# Altium footprint library Semicon-Discrete.pcblib: 205 footprints (part 5 of 13)
Each footprint in its own frame and in the unit in brackets; x right, y up, seen from the top. Pads: shape width x height; smd on the part's side, far side on the other; paste and mask are expansions set on the pad; w line width, h text height; cw(c..) or ccw(c..) is an arc to the next point about the centre after c.
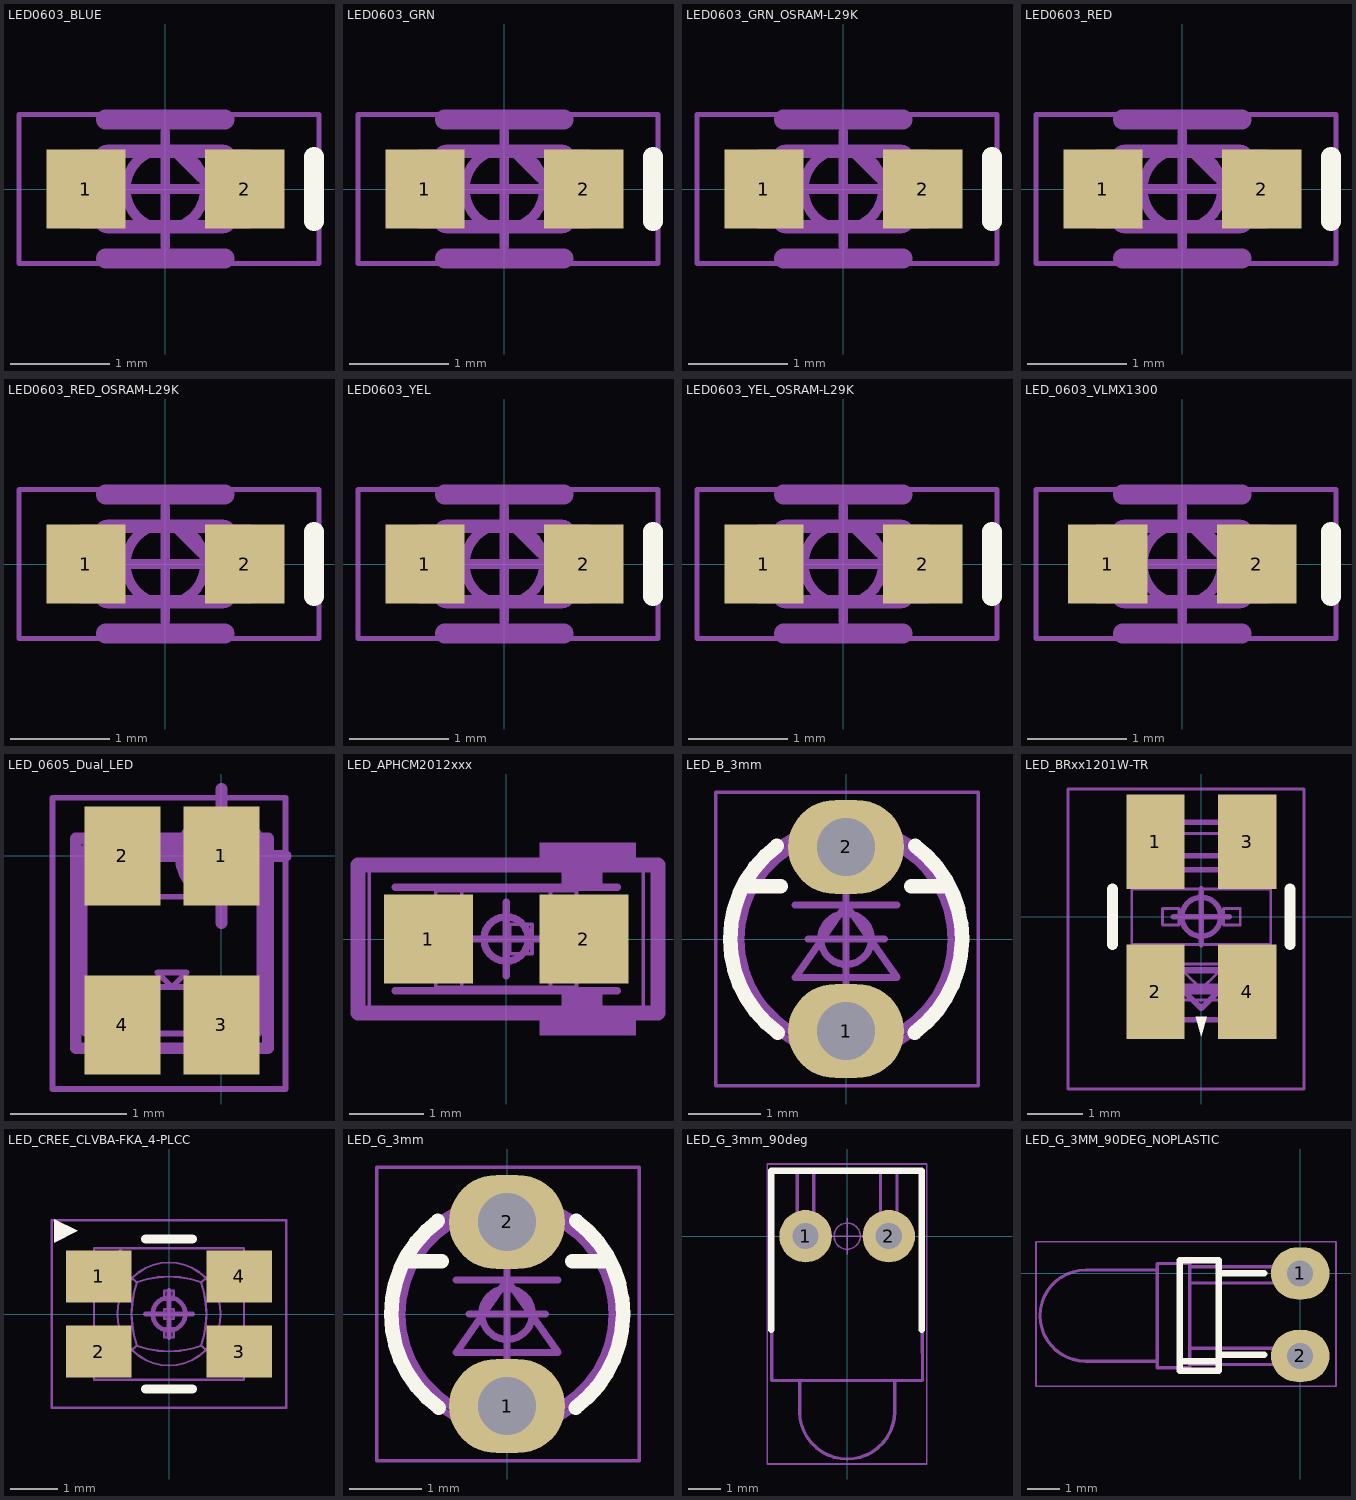
[diagram p4: the footprints below, top view; thin cyan lines are the x and y axes]

## LED0603_BLUE [mm] "SMT LED - 0603 - BLUE"
height 0.65
pads (2):
  rect 0.8x0.8 smd: 1(-0.8,0) 2(0.8,0)
TopOverlay:
  lines w0.2: 1.5,-0.325 1.5,0.325
2-TopCompOutl:
  lines w0.1: 0.1,0.375 0.637,-0.163
  lines w0.102: -0.65,-0.3 cw(c-0.7,-0.3) -0.7,-0.35 -0.85,-0.35 -0.85,0.35 -0.7,0.35 cw(c-0.7,0.3) -0.65,0.3 ; -0.65,-0.3 -0.65,-0.357 ccw(c-0.562,-0.312) -0.629,-0.385 ccw(c-0.548,-0.177) -0.55,-0.4 ; -0.65,-0.3 -0.612,-0.262 ; -0.65,-0.3 -0.65,0.3 ; -0.65,0.3 -0.612,0.262 ; -0.65,0.3 -0.65,0.357 cw(c-0.562,0.312) -0.629,0.385 cw(c-0.548,0.177) -0.55,0.4 ; -0.612,-0.262 ccw(c-0.512,-0.262) -0.512,-0.362 ; -0.612,-0.262 -0.612,0.262 ; -0.612,0.262 cw(c-0.512,0.262) -0.512,0.362 ; -0.55,-0.4 -0.512,-0.362 ; -0.55,-0.4 0.55,-0.4 ; -0.55,0.4 -0.512,0.362 ; -0.55,0.4 0.55,0.4 ; -0.512,-0.362 0.512,-0.362 ; -0.512,0.362 0.512,0.362 ; 0.512,-0.362 ccw(c0.512,-0.262) 0.612,-0.262 ; 0.512,-0.362 0.55,-0.4 ; 0.512,0.362 cw(c0.512,0.262) 0.612,0.262 ; 0.512,0.362 0.55,0.4 ; 0.55,-0.4 ccw(c0.548,-0.177) 0.629,-0.385 ccw(c0.562,-0.312) 0.65,-0.357 0.65,-0.3 ; 0.55,0.4 cw(c0.548,0.179) 0.629,0.385 cw(c0.562,0.312) 0.65,0.357 0.65,0.3 ; 0.612,-0.262 0.612,0.262 ; 0.612,-0.262 0.65,-0.3 ; 0.612,0.262 0.65,0.3 ; 0.65,-0.3 ccw(c0.7,-0.3) 0.7,-0.35 0.85,-0.35 0.85,0.35 0.7,0.35 ccw(c0.7,0.3) 0.65,0.3 ; 0.65,-0.3 0.65,0.3
4-TopCourty:
  circle w0.1: c0,0 r0.4
  lines w0.05: -1.475,-0.75 -1.475,0.75 1.55,0.75 1.55,-0.75 -1.475,-0.75
  lines w0.1: -0.55,0 0.55,0 ; 0,-0.575 0,0.575
7-TopAssy:
  lines w0.1: 0.1,0.375 0.637,-0.163
  lines w0.102: -0.65,-0.3 cw(c-0.7,-0.3) -0.7,-0.35 -0.85,-0.35 -0.85,0.35 -0.7,0.35 cw(c-0.7,0.3) -0.65,0.3 ; -0.65,-0.3 -0.65,0.3 ; -0.65,-0.3 -0.612,-0.262 ; -0.65,-0.3 -0.65,-0.357 ccw(c-0.562,-0.312) -0.629,-0.385 ccw(c-0.548,-0.177) -0.55,-0.4 ; -0.65,0.3 -0.65,0.357 cw(c-0.562,0.312) -0.629,0.385 cw(c-0.548,0.177) -0.55,0.4 ; -0.65,0.3 -0.612,0.262 ; -0.612,-0.262 ccw(c-0.512,-0.262) -0.512,-0.362 ; -0.612,-0.262 -0.612,0.262 ; -0.612,0.262 cw(c-0.512,0.262) -0.512,0.362 ; -0.55,-0.4 0.55,-0.4 ; -0.55,-0.4 -0.512,-0.362 ; -0.55,0.4 0.55,0.4 ; -0.55,0.4 -0.512,0.362 ; -0.512,-0.362 0.512,-0.362 ; -0.512,0.362 0.512,0.362 ; 0.512,-0.362 ccw(c0.512,-0.262) 0.612,-0.262 ; 0.512,-0.362 0.55,-0.4 ; 0.512,0.362 cw(c0.512,0.262) 0.612,0.262 ; 0.512,0.362 0.55,0.4 ; 0.55,-0.4 ccw(c0.548,-0.177) 0.629,-0.385 ccw(c0.562,-0.312) 0.65,-0.357 0.65,-0.3 ; 0.55,0.4 cw(c0.548,0.179) 0.629,0.385 cw(c0.562,0.312) 0.65,0.357 0.65,0.3 ; 0.612,-0.262 0.65,-0.3 ; 0.612,-0.262 0.612,0.262 ; 0.612,0.262 0.65,0.3 ; 0.65,-0.3 ccw(c0.7,-0.3) 0.7,-0.35 0.85,-0.35 0.85,0.35 0.7,0.35 ccw(c0.7,0.3) 0.65,0.3 ; 0.65,-0.3 0.65,0.3
  text ".Designator" at -0.95,0.525 h1.6
13-SMDTopOverlay:
  lines w0.2: -0.6,-0.7 0.6,-0.7 ; -0.6,0.7 0.6,0.7
3D body "LED0603_BLUE.STEP": height 0.65, standoff 0, extent -0.85,-0.4 0.85,0.4

## LED0603_GRN [mm] "SMT LED - 0603 - GREEN"
height 0.65
pads (2):
  rect 0.8x0.8 smd: 1(-0.8,0) 2(0.8,0)
TopOverlay:
  lines w0.2: 1.5,-0.325 1.5,0.325
2-TopCompOutl:
  lines w0.1: 0.1,0.375 0.637,-0.163
  lines w0.102: -0.65,-0.3 cw(c-0.7,-0.3) -0.7,-0.35 -0.85,-0.35 -0.85,0.35 -0.7,0.35 cw(c-0.7,0.3) -0.65,0.3 ; -0.65,-0.3 -0.65,-0.357 ccw(c-0.562,-0.312) -0.629,-0.385 ccw(c-0.548,-0.177) -0.55,-0.4 ; -0.65,-0.3 -0.612,-0.262 ; -0.65,-0.3 -0.65,0.3 ; -0.65,0.3 -0.612,0.262 ; -0.65,0.3 -0.65,0.357 cw(c-0.562,0.312) -0.629,0.385 cw(c-0.548,0.177) -0.55,0.4 ; -0.612,-0.262 ccw(c-0.512,-0.262) -0.512,-0.362 ; -0.612,-0.262 -0.612,0.262 ; -0.612,0.262 cw(c-0.512,0.262) -0.512,0.362 ; -0.55,-0.4 -0.512,-0.362 ; -0.55,-0.4 0.55,-0.4 ; -0.55,0.4 -0.512,0.362 ; -0.55,0.4 0.55,0.4 ; -0.512,-0.362 0.512,-0.362 ; -0.512,0.362 0.512,0.362 ; 0.512,-0.362 ccw(c0.512,-0.262) 0.612,-0.262 ; 0.512,-0.362 0.55,-0.4 ; 0.512,0.362 cw(c0.512,0.262) 0.612,0.262 ; 0.512,0.362 0.55,0.4 ; 0.55,-0.4 ccw(c0.548,-0.177) 0.629,-0.385 ccw(c0.562,-0.312) 0.65,-0.357 0.65,-0.3 ; 0.55,0.4 cw(c0.548,0.179) 0.629,0.385 cw(c0.562,0.312) 0.65,0.357 0.65,0.3 ; 0.612,-0.262 0.612,0.262 ; 0.612,-0.262 0.65,-0.3 ; 0.612,0.262 0.65,0.3 ; 0.65,-0.3 ccw(c0.7,-0.3) 0.7,-0.35 0.85,-0.35 0.85,0.35 0.7,0.35 ccw(c0.7,0.3) 0.65,0.3 ; 0.65,-0.3 0.65,0.3
4-TopCourty:
  circle w0.1: c0,0 r0.4
  lines w0.05: -1.475,-0.75 -1.475,0.75 1.55,0.75 1.55,-0.75 -1.475,-0.75
  lines w0.1: -0.55,0 0.55,0 ; 0,-0.575 0,0.575
7-TopAssy:
  lines w0.1: 0.1,0.375 0.637,-0.163
  lines w0.102: -0.65,-0.3 cw(c-0.7,-0.3) -0.7,-0.35 -0.85,-0.35 -0.85,0.35 -0.7,0.35 cw(c-0.7,0.3) -0.65,0.3 ; -0.65,-0.3 -0.65,0.3 ; -0.65,-0.3 -0.612,-0.262 ; -0.65,-0.3 -0.65,-0.357 ccw(c-0.562,-0.312) -0.629,-0.385 ccw(c-0.548,-0.177) -0.55,-0.4 ; -0.65,0.3 -0.65,0.357 cw(c-0.562,0.312) -0.629,0.385 cw(c-0.548,0.177) -0.55,0.4 ; -0.65,0.3 -0.612,0.262 ; -0.612,-0.262 ccw(c-0.512,-0.262) -0.512,-0.362 ; -0.612,-0.262 -0.612,0.262 ; -0.612,0.262 cw(c-0.512,0.262) -0.512,0.362 ; -0.55,-0.4 0.55,-0.4 ; -0.55,-0.4 -0.512,-0.362 ; -0.55,0.4 0.55,0.4 ; -0.55,0.4 -0.512,0.362 ; -0.512,-0.362 0.512,-0.362 ; -0.512,0.362 0.512,0.362 ; 0.512,-0.362 ccw(c0.512,-0.262) 0.612,-0.262 ; 0.512,-0.362 0.55,-0.4 ; 0.512,0.362 cw(c0.512,0.262) 0.612,0.262 ; 0.512,0.362 0.55,0.4 ; 0.55,-0.4 ccw(c0.548,-0.177) 0.629,-0.385 ccw(c0.562,-0.312) 0.65,-0.357 0.65,-0.3 ; 0.55,0.4 cw(c0.548,0.179) 0.629,0.385 cw(c0.562,0.312) 0.65,0.357 0.65,0.3 ; 0.612,-0.262 0.65,-0.3 ; 0.612,-0.262 0.612,0.262 ; 0.612,0.262 0.65,0.3 ; 0.65,-0.3 ccw(c0.7,-0.3) 0.7,-0.35 0.85,-0.35 0.85,0.35 0.7,0.35 ccw(c0.7,0.3) 0.65,0.3 ; 0.65,-0.3 0.65,0.3
  text ".Designator" at -0.95,0.525 h1.6
13-SMDTopOverlay:
  lines w0.2: -0.6,-0.7 0.6,-0.7 ; -0.6,0.7 0.6,0.7
3D body "LED0603_GRN_OSRAM-L29K.STEP": height 0.65, standoff 0, extent -0.85,-0.4 0.85,0.4

## LED0603_GRN_OSRAM-L29K [mm] "SMT LED - 0603 - GREEN - OSRAM - L29K"
height 0.65
pads (2):
  rect 0.8x0.8 smd: 1(-0.8,0) 2(0.8,0)
TopOverlay:
  lines w0.2: 1.5,-0.325 1.5,0.325
2-TopCompOutl:
  lines w0.1: 0.1,0.375 0.637,-0.163
  lines w0.102: -0.65,-0.3 cw(c-0.7,-0.3) -0.7,-0.35 -0.85,-0.35 -0.85,0.35 -0.7,0.35 cw(c-0.7,0.3) -0.65,0.3 ; -0.65,-0.3 -0.65,0.3 ; -0.65,-0.3 -0.612,-0.262 ; -0.65,-0.3 -0.65,-0.357 ccw(c-0.562,-0.312) -0.629,-0.385 ccw(c-0.548,-0.177) -0.55,-0.4 ; -0.65,0.3 -0.65,0.357 cw(c-0.562,0.312) -0.629,0.385 cw(c-0.548,0.177) -0.55,0.4 ; -0.65,0.3 -0.612,0.262 ; -0.612,-0.262 ccw(c-0.512,-0.262) -0.512,-0.362 ; -0.612,-0.262 -0.612,0.262 ; -0.612,0.262 cw(c-0.512,0.262) -0.512,0.362 ; -0.55,-0.4 0.55,-0.4 ; -0.55,-0.4 -0.512,-0.362 ; -0.55,0.4 0.55,0.4 ; -0.55,0.4 -0.512,0.362 ; -0.512,-0.362 0.512,-0.362 ; -0.512,0.362 0.512,0.362 ; 0.512,-0.362 ccw(c0.512,-0.262) 0.612,-0.262 ; 0.512,-0.362 0.55,-0.4 ; 0.512,0.362 cw(c0.512,0.262) 0.612,0.262 ; 0.512,0.362 0.55,0.4 ; 0.55,-0.4 ccw(c0.548,-0.177) 0.629,-0.385 ccw(c0.562,-0.312) 0.65,-0.357 0.65,-0.3 ; 0.55,0.4 cw(c0.548,0.179) 0.629,0.385 cw(c0.562,0.312) 0.65,0.357 0.65,0.3 ; 0.612,-0.262 0.65,-0.3 ; 0.612,-0.262 0.612,0.262 ; 0.612,0.262 0.65,0.3 ; 0.65,-0.3 ccw(c0.7,-0.3) 0.7,-0.35 0.85,-0.35 0.85,0.35 0.7,0.35 ccw(c0.7,0.3) 0.65,0.3 ; 0.65,-0.3 0.65,0.3
4-TopCourty:
  circle w0.1: c0,0 r0.4
  lines w0.05: -1.475,-0.75 1.55,-0.75 1.55,0.75 -1.475,0.75 -1.475,-0.75
  lines w0.1: -0.55,0 0.55,0 ; 0,-0.575 0,0.575
7-TopAssy:
  lines w0.1: 0.1,0.375 0.637,-0.163
  lines w0.102: -0.65,-0.3 cw(c-0.7,-0.3) -0.7,-0.35 -0.85,-0.35 -0.85,0.35 -0.7,0.35 cw(c-0.7,0.3) -0.65,0.3 ; -0.65,-0.3 -0.65,-0.357 ccw(c-0.562,-0.312) -0.629,-0.385 ccw(c-0.548,-0.177) -0.55,-0.4 ; -0.65,-0.3 -0.612,-0.262 ; -0.65,-0.3 -0.65,0.3 ; -0.65,0.3 -0.612,0.262 ; -0.65,0.3 -0.65,0.357 cw(c-0.562,0.312) -0.629,0.385 cw(c-0.548,0.177) -0.55,0.4 ; -0.612,-0.262 ccw(c-0.512,-0.262) -0.512,-0.362 ; -0.612,-0.262 -0.612,0.262 ; -0.612,0.262 cw(c-0.512,0.262) -0.512,0.362 ; -0.55,-0.4 -0.512,-0.362 ; -0.55,-0.4 0.55,-0.4 ; -0.55,0.4 -0.512,0.362 ; -0.55,0.4 0.55,0.4 ; -0.512,-0.362 0.512,-0.362 ; -0.512,0.362 0.512,0.362 ; 0.512,-0.362 ccw(c0.512,-0.262) 0.612,-0.262 ; 0.512,-0.362 0.55,-0.4 ; 0.512,0.362 cw(c0.512,0.262) 0.612,0.262 ; 0.512,0.362 0.55,0.4 ; 0.55,-0.4 ccw(c0.548,-0.177) 0.629,-0.385 ccw(c0.562,-0.312) 0.65,-0.357 0.65,-0.3 ; 0.55,0.4 cw(c0.548,0.179) 0.629,0.385 cw(c0.562,0.312) 0.65,0.357 0.65,0.3 ; 0.612,-0.262 0.612,0.262 ; 0.612,-0.262 0.65,-0.3 ; 0.612,0.262 0.65,0.3 ; 0.65,-0.3 ccw(c0.7,-0.3) 0.7,-0.35 0.85,-0.35 0.85,0.35 0.7,0.35 ccw(c0.7,0.3) 0.65,0.3 ; 0.65,-0.3 0.65,0.3
  text ".Designator" at -0.95,0.525 h1.6
13-SMDTopOverlay:
  lines w0.2: -0.6,-0.7 0.6,-0.7 ; -0.6,0.7 0.6,0.7
3D body "LED0603_GRN_OSRAM-L29K.STEP": height 0.65, standoff 0, extent -0.85,-0.4 0.85,0.4

## LED0603_RED [mm] "SMT LED - 0603 - RED"
height 0.65
pads (2):
  rect 0.8x0.8 smd: 1(-0.8,0) 2(0.8,0)
TopOverlay:
  lines w0.2: 1.5,-0.325 1.5,0.325
2-TopCompOutl:
  lines w0.1: 0.1,0.375 0.637,-0.163
  lines w0.102: -0.65,-0.3 cw(c-0.7,-0.3) -0.7,-0.35 -0.85,-0.35 -0.85,0.35 -0.7,0.35 cw(c-0.7,0.3) -0.65,0.3 ; -0.65,-0.3 -0.65,-0.357 ccw(c-0.562,-0.312) -0.629,-0.385 ccw(c-0.548,-0.177) -0.55,-0.4 ; -0.65,-0.3 -0.612,-0.262 ; -0.65,-0.3 -0.65,0.3 ; -0.65,0.3 -0.612,0.262 ; -0.65,0.3 -0.65,0.357 cw(c-0.562,0.312) -0.629,0.385 cw(c-0.548,0.177) -0.55,0.4 ; -0.612,-0.262 ccw(c-0.512,-0.262) -0.512,-0.362 ; -0.612,-0.262 -0.612,0.262 ; -0.612,0.262 cw(c-0.512,0.262) -0.512,0.362 ; -0.55,-0.4 -0.512,-0.362 ; -0.55,-0.4 0.55,-0.4 ; -0.55,0.4 -0.512,0.362 ; -0.55,0.4 0.55,0.4 ; -0.512,-0.362 0.512,-0.362 ; -0.512,0.362 0.512,0.362 ; 0.512,-0.362 ccw(c0.512,-0.262) 0.612,-0.262 ; 0.512,-0.362 0.55,-0.4 ; 0.512,0.362 cw(c0.512,0.262) 0.612,0.262 ; 0.512,0.362 0.55,0.4 ; 0.55,-0.4 ccw(c0.548,-0.177) 0.629,-0.385 ccw(c0.562,-0.312) 0.65,-0.357 0.65,-0.3 ; 0.55,0.4 cw(c0.548,0.179) 0.629,0.385 cw(c0.562,0.312) 0.65,0.357 0.65,0.3 ; 0.612,-0.262 0.612,0.262 ; 0.612,-0.262 0.65,-0.3 ; 0.612,0.262 0.65,0.3 ; 0.65,-0.3 ccw(c0.7,-0.3) 0.7,-0.35 0.85,-0.35 0.85,0.35 0.7,0.35 ccw(c0.7,0.3) 0.65,0.3 ; 0.65,-0.3 0.65,0.3
4-TopCourty:
  circle w0.1: c0,0 r0.4
  lines w0.05: -1.475,-0.75 -1.475,0.75 1.55,0.75 1.55,-0.75 -1.475,-0.75
  lines w0.1: -0.55,0 0.55,0 ; 0,-0.575 0,0.575
7-TopAssy:
  lines w0.1: 0.1,0.375 0.637,-0.163
  lines w0.102: -0.65,-0.3 cw(c-0.7,-0.3) -0.7,-0.35 -0.85,-0.35 -0.85,0.35 -0.7,0.35 cw(c-0.7,0.3) -0.65,0.3 ; -0.65,-0.3 -0.65,0.3 ; -0.65,-0.3 -0.612,-0.262 ; -0.65,-0.3 -0.65,-0.357 ccw(c-0.562,-0.312) -0.629,-0.385 ccw(c-0.548,-0.177) -0.55,-0.4 ; -0.65,0.3 -0.65,0.357 cw(c-0.562,0.312) -0.629,0.385 cw(c-0.548,0.177) -0.55,0.4 ; -0.65,0.3 -0.612,0.262 ; -0.612,-0.262 ccw(c-0.512,-0.262) -0.512,-0.362 ; -0.612,-0.262 -0.612,0.262 ; -0.612,0.262 cw(c-0.512,0.262) -0.512,0.362 ; -0.55,-0.4 0.55,-0.4 ; -0.55,-0.4 -0.512,-0.362 ; -0.55,0.4 0.55,0.4 ; -0.55,0.4 -0.512,0.362 ; -0.512,-0.362 0.512,-0.362 ; -0.512,0.362 0.512,0.362 ; 0.512,-0.362 ccw(c0.512,-0.262) 0.612,-0.262 ; 0.512,-0.362 0.55,-0.4 ; 0.512,0.362 cw(c0.512,0.262) 0.612,0.262 ; 0.512,0.362 0.55,0.4 ; 0.55,-0.4 ccw(c0.548,-0.177) 0.629,-0.385 ccw(c0.562,-0.312) 0.65,-0.357 0.65,-0.3 ; 0.55,0.4 cw(c0.548,0.179) 0.629,0.385 cw(c0.562,0.312) 0.65,0.357 0.65,0.3 ; 0.612,-0.262 0.65,-0.3 ; 0.612,-0.262 0.612,0.262 ; 0.612,0.262 0.65,0.3 ; 0.65,-0.3 ccw(c0.7,-0.3) 0.7,-0.35 0.85,-0.35 0.85,0.35 0.7,0.35 ccw(c0.7,0.3) 0.65,0.3 ; 0.65,-0.3 0.65,0.3
  text ".Designator" at -0.95,0.525 h1.6
13-SMDTopOverlay:
  lines w0.2: -0.6,-0.7 0.6,-0.7 ; -0.6,0.7 0.6,0.7
3D body "LED0603_OSRAM-L29K.STEP": height 0.65, standoff 0, extent -0.85,-0.4 0.85,0.4

## LED0603_RED_OSRAM-L29K [mm] "SMT LED - 0603 - RED - OSRAM - L29K"
height 0.65
pads (2):
  rect 0.8x0.8 smd: 1(-0.8,0) 2(0.8,0)
TopOverlay:
  lines w0.2: 1.5,-0.325 1.5,0.325
2-TopCompOutl:
  lines w0.1: 0.1,0.375 0.637,-0.163
  lines w0.102: -0.65,-0.3 cw(c-0.7,-0.3) -0.7,-0.35 -0.85,-0.35 -0.85,0.35 -0.7,0.35 cw(c-0.7,0.3) -0.65,0.3 ; -0.65,-0.3 -0.65,0.3 ; -0.65,-0.3 -0.612,-0.262 ; -0.65,-0.3 -0.65,-0.357 ccw(c-0.562,-0.312) -0.629,-0.385 ccw(c-0.548,-0.177) -0.55,-0.4 ; -0.65,0.3 -0.65,0.357 cw(c-0.562,0.312) -0.629,0.385 cw(c-0.548,0.177) -0.55,0.4 ; -0.65,0.3 -0.612,0.262 ; -0.612,-0.262 ccw(c-0.512,-0.262) -0.512,-0.362 ; -0.612,-0.262 -0.612,0.262 ; -0.612,0.262 cw(c-0.512,0.262) -0.512,0.362 ; -0.55,-0.4 0.55,-0.4 ; -0.55,-0.4 -0.512,-0.362 ; -0.55,0.4 0.55,0.4 ; -0.55,0.4 -0.512,0.362 ; -0.512,-0.362 0.512,-0.362 ; -0.512,0.362 0.512,0.362 ; 0.512,-0.362 ccw(c0.512,-0.262) 0.612,-0.262 ; 0.512,-0.362 0.55,-0.4 ; 0.512,0.362 cw(c0.512,0.262) 0.612,0.262 ; 0.512,0.362 0.55,0.4 ; 0.55,-0.4 ccw(c0.548,-0.177) 0.629,-0.385 ccw(c0.562,-0.312) 0.65,-0.357 0.65,-0.3 ; 0.55,0.4 cw(c0.548,0.179) 0.629,0.385 cw(c0.562,0.312) 0.65,0.357 0.65,0.3 ; 0.612,-0.262 0.65,-0.3 ; 0.612,-0.262 0.612,0.262 ; 0.612,0.262 0.65,0.3 ; 0.65,-0.3 ccw(c0.7,-0.3) 0.7,-0.35 0.85,-0.35 0.85,0.35 0.7,0.35 ccw(c0.7,0.3) 0.65,0.3 ; 0.65,-0.3 0.65,0.3
4-TopCourty:
  circle w0.1: c0,0 r0.4
  lines w0.05: -1.475,-0.75 1.55,-0.75 1.55,0.75 -1.475,0.75 -1.475,-0.75
  lines w0.1: -0.55,0 0.55,0 ; 0,-0.575 0,0.575
7-TopAssy:
  lines w0.1: 0.1,0.375 0.637,-0.163
  lines w0.102: -0.65,-0.3 cw(c-0.7,-0.3) -0.7,-0.35 -0.85,-0.35 -0.85,0.35 -0.7,0.35 cw(c-0.7,0.3) -0.65,0.3 ; -0.65,-0.3 -0.65,-0.357 ccw(c-0.562,-0.312) -0.629,-0.385 ccw(c-0.548,-0.177) -0.55,-0.4 ; -0.65,-0.3 -0.612,-0.262 ; -0.65,-0.3 -0.65,0.3 ; -0.65,0.3 -0.612,0.262 ; -0.65,0.3 -0.65,0.357 cw(c-0.562,0.312) -0.629,0.385 cw(c-0.548,0.177) -0.55,0.4 ; -0.612,-0.262 ccw(c-0.512,-0.262) -0.512,-0.362 ; -0.612,-0.262 -0.612,0.262 ; -0.612,0.262 cw(c-0.512,0.262) -0.512,0.362 ; -0.55,-0.4 -0.512,-0.362 ; -0.55,-0.4 0.55,-0.4 ; -0.55,0.4 -0.512,0.362 ; -0.55,0.4 0.55,0.4 ; -0.512,-0.362 0.512,-0.362 ; -0.512,0.362 0.512,0.362 ; 0.512,-0.362 ccw(c0.512,-0.262) 0.612,-0.262 ; 0.512,-0.362 0.55,-0.4 ; 0.512,0.362 cw(c0.512,0.262) 0.612,0.262 ; 0.512,0.362 0.55,0.4 ; 0.55,-0.4 ccw(c0.548,-0.177) 0.629,-0.385 ccw(c0.562,-0.312) 0.65,-0.357 0.65,-0.3 ; 0.55,0.4 cw(c0.548,0.179) 0.629,0.385 cw(c0.562,0.312) 0.65,0.357 0.65,0.3 ; 0.612,-0.262 0.612,0.262 ; 0.612,-0.262 0.65,-0.3 ; 0.612,0.262 0.65,0.3 ; 0.65,-0.3 ccw(c0.7,-0.3) 0.7,-0.35 0.85,-0.35 0.85,0.35 0.7,0.35 ccw(c0.7,0.3) 0.65,0.3 ; 0.65,-0.3 0.65,0.3
  text ".Designator" at -0.95,0.525 h1.6
13-SMDTopOverlay:
  lines w0.2: -0.6,-0.7 0.6,-0.7 ; -0.6,0.7 0.6,0.7
3D body "LED0603_OSRAM-L29K.STEP": height 0.65, standoff 0, extent -0.85,-0.4 0.85,0.4

## LED0603_YEL [mm] "SMT LED - 0603 - YELLOW"
height 0.65
pads (2):
  rect 0.8x0.8 smd: 1(-0.8,0) 2(0.8,0)
TopOverlay:
  lines w0.2: 1.5,-0.325 1.5,0.325
2-TopCompOutl:
  lines w0.1: 0.1,0.375 0.637,-0.163
  lines w0.102: -0.65,-0.3 cw(c-0.7,-0.3) -0.7,-0.35 -0.85,-0.35 -0.85,0.35 -0.7,0.35 cw(c-0.7,0.3) -0.65,0.3 ; -0.65,-0.3 -0.65,-0.357 ccw(c-0.562,-0.312) -0.629,-0.385 ccw(c-0.548,-0.177) -0.55,-0.4 ; -0.65,-0.3 -0.612,-0.262 ; -0.65,-0.3 -0.65,0.3 ; -0.65,0.3 -0.612,0.262 ; -0.65,0.3 -0.65,0.357 cw(c-0.562,0.312) -0.629,0.385 cw(c-0.548,0.177) -0.55,0.4 ; -0.612,-0.262 ccw(c-0.512,-0.262) -0.512,-0.362 ; -0.612,-0.262 -0.612,0.262 ; -0.612,0.262 cw(c-0.512,0.262) -0.512,0.362 ; -0.55,-0.4 -0.512,-0.362 ; -0.55,-0.4 0.55,-0.4 ; -0.55,0.4 -0.512,0.362 ; -0.55,0.4 0.55,0.4 ; -0.512,-0.362 0.512,-0.362 ; -0.512,0.362 0.512,0.362 ; 0.512,-0.362 ccw(c0.512,-0.262) 0.612,-0.262 ; 0.512,-0.362 0.55,-0.4 ; 0.512,0.362 cw(c0.512,0.262) 0.612,0.262 ; 0.512,0.362 0.55,0.4 ; 0.55,-0.4 ccw(c0.548,-0.177) 0.629,-0.385 ccw(c0.562,-0.312) 0.65,-0.357 0.65,-0.3 ; 0.55,0.4 cw(c0.548,0.179) 0.629,0.385 cw(c0.562,0.312) 0.65,0.357 0.65,0.3 ; 0.612,-0.262 0.612,0.262 ; 0.612,-0.262 0.65,-0.3 ; 0.612,0.262 0.65,0.3 ; 0.65,-0.3 ccw(c0.7,-0.3) 0.7,-0.35 0.85,-0.35 0.85,0.35 0.7,0.35 ccw(c0.7,0.3) 0.65,0.3 ; 0.65,-0.3 0.65,0.3
4-TopCourty:
  circle w0.1: c0,0 r0.4
  lines w0.05: -1.475,-0.75 -1.475,0.75 1.55,0.75 1.55,-0.75 -1.475,-0.75
  lines w0.1: -0.55,0 0.55,0 ; 0,-0.575 0,0.575
7-TopAssy:
  lines w0.1: 0.1,0.375 0.637,-0.163
  lines w0.102: -0.65,-0.3 cw(c-0.7,-0.3) -0.7,-0.35 -0.85,-0.35 -0.85,0.35 -0.7,0.35 cw(c-0.7,0.3) -0.65,0.3 ; -0.65,-0.3 -0.65,0.3 ; -0.65,-0.3 -0.612,-0.262 ; -0.65,-0.3 -0.65,-0.357 ccw(c-0.562,-0.312) -0.629,-0.385 ccw(c-0.548,-0.177) -0.55,-0.4 ; -0.65,0.3 -0.65,0.357 cw(c-0.562,0.312) -0.629,0.385 cw(c-0.548,0.177) -0.55,0.4 ; -0.65,0.3 -0.612,0.262 ; -0.612,-0.262 ccw(c-0.512,-0.262) -0.512,-0.362 ; -0.612,-0.262 -0.612,0.262 ; -0.612,0.262 cw(c-0.512,0.262) -0.512,0.362 ; -0.55,-0.4 0.55,-0.4 ; -0.55,-0.4 -0.512,-0.362 ; -0.55,0.4 0.55,0.4 ; -0.55,0.4 -0.512,0.362 ; -0.512,-0.362 0.512,-0.362 ; -0.512,0.362 0.512,0.362 ; 0.512,-0.362 ccw(c0.512,-0.262) 0.612,-0.262 ; 0.512,-0.362 0.55,-0.4 ; 0.512,0.362 cw(c0.512,0.262) 0.612,0.262 ; 0.512,0.362 0.55,0.4 ; 0.55,-0.4 ccw(c0.548,-0.177) 0.629,-0.385 ccw(c0.562,-0.312) 0.65,-0.357 0.65,-0.3 ; 0.55,0.4 cw(c0.548,0.179) 0.629,0.385 cw(c0.562,0.312) 0.65,0.357 0.65,0.3 ; 0.612,-0.262 0.65,-0.3 ; 0.612,-0.262 0.612,0.262 ; 0.612,0.262 0.65,0.3 ; 0.65,-0.3 ccw(c0.7,-0.3) 0.7,-0.35 0.85,-0.35 0.85,0.35 0.7,0.35 ccw(c0.7,0.3) 0.65,0.3 ; 0.65,-0.3 0.65,0.3
  text ".Designator" at -0.95,0.525 h1.6
13-SMDTopOverlay:
  lines w0.2: -0.6,-0.7 0.6,-0.7 ; -0.6,0.7 0.6,0.7
3D body "LED0603_YEL_OSRAM-L29K.STEP": height 0.65, standoff 0, extent -0.85,-0.4 0.85,0.4

## LED0603_YEL_OSRAM-L29K [mm] "SMT LED - 0603 - YELLOW - OSRAM - L29K"
height 0.65
pads (2):
  rect 0.8x0.8 smd: 1(-0.8,0) 2(0.8,0)
TopOverlay:
  lines w0.2: 1.5,-0.325 1.5,0.325
2-TopCompOutl:
  lines w0.1: 0.1,0.375 0.637,-0.163
  lines w0.102: -0.65,-0.3 cw(c-0.7,-0.3) -0.7,-0.35 -0.85,-0.35 -0.85,0.35 -0.7,0.35 cw(c-0.7,0.3) -0.65,0.3 ; -0.65,-0.3 -0.65,0.3 ; -0.65,-0.3 -0.612,-0.262 ; -0.65,-0.3 -0.65,-0.357 ccw(c-0.562,-0.312) -0.629,-0.385 ccw(c-0.548,-0.177) -0.55,-0.4 ; -0.65,0.3 -0.65,0.357 cw(c-0.562,0.312) -0.629,0.385 cw(c-0.548,0.177) -0.55,0.4 ; -0.65,0.3 -0.612,0.262 ; -0.612,-0.262 ccw(c-0.512,-0.262) -0.512,-0.362 ; -0.612,-0.262 -0.612,0.262 ; -0.612,0.262 cw(c-0.512,0.262) -0.512,0.362 ; -0.55,-0.4 0.55,-0.4 ; -0.55,-0.4 -0.512,-0.362 ; -0.55,0.4 0.55,0.4 ; -0.55,0.4 -0.512,0.362 ; -0.512,-0.362 0.512,-0.362 ; -0.512,0.362 0.512,0.362 ; 0.512,-0.362 ccw(c0.512,-0.262) 0.612,-0.262 ; 0.512,-0.362 0.55,-0.4 ; 0.512,0.362 cw(c0.512,0.262) 0.612,0.262 ; 0.512,0.362 0.55,0.4 ; 0.55,-0.4 ccw(c0.548,-0.177) 0.629,-0.385 ccw(c0.562,-0.312) 0.65,-0.357 0.65,-0.3 ; 0.55,0.4 cw(c0.548,0.179) 0.629,0.385 cw(c0.562,0.312) 0.65,0.357 0.65,0.3 ; 0.612,-0.262 0.65,-0.3 ; 0.612,-0.262 0.612,0.262 ; 0.612,0.262 0.65,0.3 ; 0.65,-0.3 ccw(c0.7,-0.3) 0.7,-0.35 0.85,-0.35 0.85,0.35 0.7,0.35 ccw(c0.7,0.3) 0.65,0.3 ; 0.65,-0.3 0.65,0.3
4-TopCourty:
  circle w0.1: c0,0 r0.4
  lines w0.05: -1.475,-0.75 1.55,-0.75 1.55,0.75 -1.475,0.75 -1.475,-0.75
  lines w0.1: -0.55,0 0.55,0 ; 0,-0.575 0,0.575
7-TopAssy:
  lines w0.1: 0.1,0.375 0.637,-0.163
  lines w0.102: -0.65,-0.3 cw(c-0.7,-0.3) -0.7,-0.35 -0.85,-0.35 -0.85,0.35 -0.7,0.35 cw(c-0.7,0.3) -0.65,0.3 ; -0.65,-0.3 -0.65,-0.357 ccw(c-0.562,-0.312) -0.629,-0.385 ccw(c-0.548,-0.177) -0.55,-0.4 ; -0.65,-0.3 -0.612,-0.262 ; -0.65,-0.3 -0.65,0.3 ; -0.65,0.3 -0.612,0.262 ; -0.65,0.3 -0.65,0.357 cw(c-0.562,0.312) -0.629,0.385 cw(c-0.548,0.177) -0.55,0.4 ; -0.612,-0.262 ccw(c-0.512,-0.262) -0.512,-0.362 ; -0.612,-0.262 -0.612,0.262 ; -0.612,0.262 cw(c-0.512,0.262) -0.512,0.362 ; -0.55,-0.4 -0.512,-0.362 ; -0.55,-0.4 0.55,-0.4 ; -0.55,0.4 -0.512,0.362 ; -0.55,0.4 0.55,0.4 ; -0.512,-0.362 0.512,-0.362 ; -0.512,0.362 0.512,0.362 ; 0.512,-0.362 ccw(c0.512,-0.262) 0.612,-0.262 ; 0.512,-0.362 0.55,-0.4 ; 0.512,0.362 cw(c0.512,0.262) 0.612,0.262 ; 0.512,0.362 0.55,0.4 ; 0.55,-0.4 ccw(c0.548,-0.177) 0.629,-0.385 ccw(c0.562,-0.312) 0.65,-0.357 0.65,-0.3 ; 0.55,0.4 cw(c0.548,0.179) 0.629,0.385 cw(c0.562,0.312) 0.65,0.357 0.65,0.3 ; 0.612,-0.262 0.612,0.262 ; 0.612,-0.262 0.65,-0.3 ; 0.612,0.262 0.65,0.3 ; 0.65,-0.3 ccw(c0.7,-0.3) 0.7,-0.35 0.85,-0.35 0.85,0.35 0.7,0.35 ccw(c0.7,0.3) 0.65,0.3 ; 0.65,-0.3 0.65,0.3
  text ".Designator" at -0.95,0.525 h1.6
13-SMDTopOverlay:
  lines w0.2: -0.6,-0.7 0.6,-0.7 ; -0.6,0.7 0.6,0.7
3D body "LED0603_YEL_OSRAM-L29K.STEP": height 0.65, standoff 0, extent -0.85,-0.4 0.85,0.4

## LED_0603_VLMX1300 [mm] "Vishay 0603 VLMX1300 family of ChipLEDs"
height 0.4
pads (2):
  rect 0.8x0.8 smd: 1(-0.75,0) 2(0.75,0)
TopOverlay:
  lines w0.2: 1.5,-0.325 1.5,0.325
2-TopCompOutl:
  lines w0.1: 0.1,0.375 0.637,-0.163
  lines w0.102: -0.65,-0.3 cw(c-0.7,-0.3) -0.7,-0.35 -0.85,-0.35 -0.85,0.35 -0.7,0.35 cw(c-0.7,0.3) -0.65,0.3 ; -0.65,-0.3 -0.65,0.3 ; -0.65,-0.3 -0.612,-0.262 ; -0.65,-0.3 -0.65,-0.357 ccw(c-0.562,-0.312) -0.629,-0.385 ccw(c-0.548,-0.177) -0.55,-0.4 ; -0.65,0.3 -0.65,0.357 cw(c-0.562,0.312) -0.629,0.385 cw(c-0.548,0.177) -0.55,0.4 ; -0.65,0.3 -0.612,0.262 ; -0.612,-0.262 ccw(c-0.512,-0.262) -0.512,-0.362 ; -0.612,-0.262 -0.612,0.262 ; -0.612,0.262 cw(c-0.512,0.262) -0.512,0.362 ; -0.55,-0.4 0.55,-0.4 ; -0.55,-0.4 -0.512,-0.362 ; -0.55,0.4 0.55,0.4 ; -0.55,0.4 -0.512,0.362 ; -0.512,-0.362 0.512,-0.362 ; -0.512,0.362 0.512,0.362 ; 0.512,-0.362 ccw(c0.512,-0.262) 0.612,-0.262 ; 0.512,-0.362 0.55,-0.4 ; 0.512,0.362 cw(c0.512,0.262) 0.612,0.262 ; 0.512,0.362 0.55,0.4 ; 0.55,-0.4 ccw(c0.548,-0.177) 0.629,-0.385 ccw(c0.562,-0.312) 0.65,-0.357 0.65,-0.3 ; 0.55,0.4 cw(c0.548,0.179) 0.629,0.385 cw(c0.562,0.312) 0.65,0.357 0.65,0.3 ; 0.612,-0.262 0.65,-0.3 ; 0.612,-0.262 0.612,0.262 ; 0.612,0.262 0.65,0.3 ; 0.65,-0.3 ccw(c0.7,-0.3) 0.7,-0.35 0.85,-0.35 0.85,0.35 0.7,0.35 ccw(c0.7,0.3) 0.65,0.3 ; 0.65,-0.3 0.65,0.3
4-TopCourty:
  circle w0.1: c0,0 r0.4
  lines w0.05: -1.475,-0.75 1.55,-0.75 1.55,0.75 -1.475,0.75 -1.475,-0.75
  lines w0.1: -0.55,0 0.55,0 ; 0,-0.575 0,0.575
7-TopAssy:
  lines w0.1: 0.1,0.375 0.637,-0.163
  lines w0.102: -0.65,-0.3 cw(c-0.7,-0.3) -0.7,-0.35 -0.85,-0.35 -0.85,0.35 -0.7,0.35 cw(c-0.7,0.3) -0.65,0.3 ; -0.65,-0.3 -0.65,-0.357 ccw(c-0.562,-0.312) -0.629,-0.385 ccw(c-0.548,-0.177) -0.55,-0.4 ; -0.65,-0.3 -0.612,-0.262 ; -0.65,-0.3 -0.65,0.3 ; -0.65,0.3 -0.612,0.262 ; -0.65,0.3 -0.65,0.357 cw(c-0.562,0.312) -0.629,0.385 cw(c-0.548,0.177) -0.55,0.4 ; -0.612,-0.262 ccw(c-0.512,-0.262) -0.512,-0.362 ; -0.612,-0.262 -0.612,0.262 ; -0.612,0.262 cw(c-0.512,0.262) -0.512,0.362 ; -0.55,-0.4 -0.512,-0.362 ; -0.55,-0.4 0.55,-0.4 ; -0.55,0.4 -0.512,0.362 ; -0.55,0.4 0.55,0.4 ; -0.512,-0.362 0.512,-0.362 ; -0.512,0.362 0.512,0.362 ; 0.512,-0.362 ccw(c0.512,-0.262) 0.612,-0.262 ; 0.512,-0.362 0.55,-0.4 ; 0.512,0.362 cw(c0.512,0.262) 0.612,0.262 ; 0.512,0.362 0.55,0.4 ; 0.55,-0.4 ccw(c0.548,-0.177) 0.629,-0.385 ccw(c0.562,-0.312) 0.65,-0.357 0.65,-0.3 ; 0.55,0.4 cw(c0.548,0.179) 0.629,0.385 cw(c0.562,0.312) 0.65,0.357 0.65,0.3 ; 0.612,-0.262 0.612,0.262 ; 0.612,-0.262 0.65,-0.3 ; 0.612,0.262 0.65,0.3 ; 0.65,-0.3 ccw(c0.7,-0.3) 0.7,-0.35 0.85,-0.35 0.85,0.35 0.7,0.35 ccw(c0.7,0.3) 0.65,0.3 ; 0.65,-0.3 0.65,0.3
  text ".Designator" at -0.95,0.525 h1.6
13-SMDTopOverlay:
  lines w0.2: -0.6,-0.7 0.6,-0.7 ; -0.6,0.7 0.6,0.7
3D body "LED_0603_VLMX1300.STEP": height 0.55, standoff 0, extent -0.8,-0.385 0.8,0.385

## LED_0605_Dual_LED [mm]
pads (4):
  rect 0.65x0.85 smd: 1(0,0) 2(-0.85,0) 3(0,-1.45) 4(-0.85,-1.45)
2-TopCompOutl:
  lines w0.05: -1.175,-1.125 0.325,-1.125 ; -1.175,-0.35 0.325,-0.35 ; -1.175,-1.525 -1.175,0.075 -1.05,0.075 ccw(c-0.85,0.075) -0.65,0.075 -0.2,0.075 ccw(c0,0.075) 0.2,0.075 0.325,0.075 0.325,-1.525 0.2,-1.525 ccw(c0,-1.525) -0.2,-1.525 -0.65,-1.525 ccw(c-0.85,-1.525) -1.05,-1.525 -1.175,-1.525 ; -0.55,-1 -0.3,-1 -0.425,-1.125 -0.55,-1
4-TopCourty:
  circle w0.1: c0,0 r0.35
  lines w0.05: -1.45,-2 -1.45,0.5 0.55,0.5 0.55,-2 -1.45,-2
  lines w0.1: -0.55,0 0.55,0 ; 0,-0.575 0,0.575
7-TopAssy:
  lines w0.1: -1.25,-1.65 -1.25,0.15 0.4,0.15 0.4,-1.65 -1.25,-1.65
  text ".Designator" at -1.525,-1.25 h1.6

## LED_APHCM2012xxx [mm] "LED_APHCM2012xxx.ogl"
height 0.4
pads (2):
  rect 1.2x1.2 smd: 1(-1.05,0) 2(1.05,0)
2-TopCompOutl:
  lines w0.05: -0.6,-0.65 -0.6,0 -0.6,0.65 ; 0.6,-0.65 0.6,0 0.6,0.65 ; -0.95,-0.65 -0.95,-0.15 ccw(c-0.95,0) -0.8,0 ccw(c-0.95,0) -0.95,0.15 -0.95,0.65 0,0.65 0.95,0.65 0.95,0.15 ccw(c0.95,0) 0.8,0 ccw(c0.95,0) 0.95,-0.15 0.95,-0.65 0,-0.65 -0.95,-0.65 ; 0.05,-0.2 0.35,-0.2 0.35,0.2 0.05,0.2 0.05,-0.2
4-TopCourty:
  circle w0.1: c0,0 r0.3
  lines w0.05: -1.85,-0.95 1.85,-0.95 1.85,0.95 -1.85,0.95 -1.85,-0.95
  lines w0.1: -0.5,0 0.5,0 ; 0,-0.5 0,0.5
7-TopAssy:
  rectangle: 0.75,0.7 1.3,0.9
  rectangle: 0.75,-0.9 1.3,-0.7
  lines w0.1: -1.5,-0.7 0,-0.7 1.5,-0.7 ; -1.5,0.7 0,0.7 1.5,0.7
  text ".Designator" at -1.6,-0.6 h1.8
9-SMD Overlay:
  rectangle: 0.45,0.9 1.75,1.3
  rectangle: 0.45,-1.3 1.75,-0.9
13-SMDTopOverlay:
  lines w0.2: -2,-1 -2,1 2.05,1 2.05,-1 -2,-1
3D body "LED_APHCM2012xxx.STEP": height 0.4, standoff 0, extent -1,-0.675 1,0.675

## LED_B_3mm [mm]
pads (2):
  oval 1.6x1.3 hole 0.8: 1(0,-1.27) 2(0,1.27)
TopOverlay:
  lines w0.2: -1.4,0.73 -0.9,0.73 ; -0.954,1.285 ccw(c0,0) -0.945,-1.291 ; 0.9,0.73 1.4,0.73 ; 0.945,-1.291 ccw(c0,0) 0.954,1.285
2-TopCompOutl:
  lines w0.1: -0.528,-1.404 cw(c0,0) 0.528,-1.404 ; -0.525,-1.405 0.525,-1.405
4-TopCourty:
  circle w0.1: c0,0 r0.35
  lines w0.05: -1.8,-2.025 -1.8,2.025 1.825,2.025 1.825,-2.025 -1.8,-2.025
  lines w0.1: -0.525,0 0.525,0 ; 0,-0.525 0,0.525
5-MCadOutl:
  lines w0.05: -0.3,0 0,0 ; 0,-0.229 0,0 ; 0,0.254 0,0 ; 0.3,0 0,0
7-TopAssy:
  circle w0.1: c0,-0.005 r1.45
  lines w0.1: -0.7,0.47 0.7,0.47 ; -0.563,-1.498 cw(c0,0) 0.563,-1.498 ; -0.55,-1.505 0.55,-1.505 ; 0,-0.83 0,0.87 ; -0.7,-0.53 0.7,-0.53 0,0.47 -0.7,-0.53 ; -0.25,-1.53 0.25,-1.53 0.25,-1.03 -0.25,-1.03 -0.25,-1.53 ; -0.25,1.02 -0.25,1.52 0.25,1.52 0.25,1.02 -0.25,1.02
  text ".Designator" at -1.175,2.395 h2.2
3D body "LED_B_3mm.STEP": height 14.2, standoff -3.2, extent -1.6,-1.6 1.594,1.587

## LED_BRxx1201W-TR [mm]
height 1.4
pads (4):
  rect 1.05x1.7 smd: 1(-0.825,1.35) 2(-0.825,-1.35) 3(0.825,1.35) 4(0.825,-1.35)
TopOverlay:
  region: -0.1,-1.8 0.1,-1.8 0,-2.15
  lines w0.2: -1.6,-0.5 -1.6,0.5 ; 1.6,-0.5 1.6,0.5
2-TopCompOutl:
  lines w0.05: -1.25,-0.85 1.25,-0.85 ; -1.25,-0.5 1.25,-0.5 ; -1.25,0.5 1.25,0.5 ; -1.25,0.85 1.25,0.85 ; -1.25,-1.5 -1.25,0 -1.25,1.5 -1,1.5 ccw(c-0.75,1.5) -0.75,1.25 ccw(c-0.75,1.5) -0.5,1.5 0,1.5 0.5,1.5 ccw(c0.75,1.5) 0.75,1.25 ccw(c0.75,1.5) 1,1.5 1.25,1.5 1.25,0 1.25,-1.5 1,-1.5 ccw(c0.75,-1.5) 0.75,-1.25 ccw(c0.75,-1.5) 0.5,-1.5 0,-1.5 -0.5,-1.5 ccw(c-0.75,-1.5) -0.75,-1.25 ccw(c-0.75,-1.5) -1,-1.5 -1.25,-1.5 ; -0.7,-0.15 -0.4,-0.15 -0.4,0.15 -0.7,0.15 -0.7,-0.15 ; -0.3,-1 0,-1.3 0.3,-1 -0.3,-1 ; 0.4,-0.15 0.7,-0.15 0.7,0.15 0.4,0.15 0.4,-0.15
  text "C" at -0.2,-2.05 h0.7
  text "R" at -1.7,-0.25 h0.7
  text "G" at 1.3,-0.35 h0.7
4-TopCourty:
  circle w0.1: c0,0 r0.35
  lines w0.05: -2.4,-3.1 -2.4,2.3 1.85,2.3 1.85,-3.1 -2.4,-3.1
  lines w0.1: -0.5,0 0.5,0 ; 0,-0.5 0,0.5
7-TopAssy:
  lines w0.05: -1,-1.85 cw(c-0.75,-1.85) -0.75,-1.6 cw(c-0.75,-1.85) -0.5,-1.85 ; -1,1.7 ccw(c-0.75,1.7) -0.75,1.45 ccw(c-0.75,1.7) -0.5,1.7 ; 0.5,-1.85 cw(c0.75,-1.85) 0.75,-1.6 cw(c0.75,-1.85) 1,-1.85 ; 0.5,1.7 ccw(c0.75,1.7) 0.75,1.45 ccw(c0.75,1.7) 1,1.7
  lines w0.1: -1.25,-1.25 1.25,-1.25 ; -1.25,-0.95 1.25,-0.95 ; -1.25,-0.85 -1.25,-1.85 -1,-1.85 ; -1.25,0.75 -1.25,1.7 -1,1.7 ; -1.25,0.85 1.25,0.85 ; -1.25,1.1 1.25,1.1 ; -0.5,-1.85 0,-1.85 0.5,-1.85 ; -0.5,1.7 0,1.7 0.5,1.7 ; 1,-1.85 1.25,-1.85 1.25,-0.85 ; 1,1.7 1.25,1.7 1.25,0.75 ; -0.3,-1.35 0,-1.65 0.3,-1.35 -0.3,-1.35
  text "C" at -0.2,-2.4 h0.7
  text ".Designator" at -1.45,-0.6 h1.8
3D body "LED_BRxx1201W-TR.STEP": height 0.4, standoff 0, extent -1.25,-1.5 1.25,1.5

## LED_CREE_CLVBA-FKA_4-PLCC [mm] "LED RGB SMD DIFF 4-PLCC"
height 1.9
pads (4):
  rect 1.4x1.1 smd: 1(-1.5,0.8) 2(-1.5,-0.8) 3(1.5,-0.8) 4(1.5,0.8)
TopOverlay:
  region: -2.45,1.525 -2.45,2.025 -1.95,1.775
  lines w0.2: -0.5,-1.6 0.5,-1.6 ; -0.5,1.6 0.5,1.6
2-TopCompOutl:
  lines w0.05: -1.6,-1 -1.8,-1 -1.8,-0.3 -1.6,-0.3 ; -1.6,0.3 -1.8,0.3 -1.8,1 -1.6,1 ; -1.6,0.8 -1,1.4 ; -0.775,-0.75 -0.675,-0.675 ; -0.775,0.75 -0.675,0.675 ; -0.682,-0.677 cw(c1.2,0) -0.8,0 cw(c1.2,0) -0.682,0.677 ; -0.677,-0.682 ccw(c0,1.2) 0,-0.8 ccw(c0,1.2) 0.677,-0.682 ; -0.677,0.682 cw(c0,-1.2) 0,0.8 cw(c0,-1.2) 0.677,0.682 ; 0.675,-0.675 0.775,-0.75 ; 0.675,0.675 0.775,0.75 ; 0.682,-0.677 ccw(c-1.2,0) 0.8,0 ccw(c-1.2,0) 0.682,0.677 ; 1.6,-1 1.8,-1 1.8,-0.3 1.6,-0.3 ; 1.6,0.3 1.8,0.3 1.8,1 1.6,1 ; -1.6,-1.4 -1.6,0 -1.6,1.4 0,1.4 1.6,1.4 1.6,0 1.6,-1.4 0,-1.4 -1.6,-1.4 ; -1.1,0 ccw(c0,0) 0,-1.1 ccw(c0,0) 1.1,0 ccw(c0,0) 0,1.1 ccw(c0,0) -1.1,0 ; -0.1,-0.5 0.1,-0.5 0.1,-0.3 -0.1,-0.3 -0.1,-0.5 ; -0.1,-0.1 -0.1,0.1 0.1,0.1 0.1,-0.1 -0.1,-0.1 ; -0.1,0.3 0.1,0.3 0.1,0.5 -0.1,0.5 -0.1,0.3
  text "C" at -2.3,-0.9 h0.7
  text "B" at 2,-0.9 h0.7
  text "G" at 2,0.5 h0.7
  text "R" at -2.3,0.5 h0.7
4-TopCourty:
  circle w0.1: c0,0 r0.35
  lines w0.05: -2.5,-2 -2.5,2 2.5,2 2.5,-2 -2.5,-2
  lines w0.1: -0.5,0 0.5,0 ; 0,-0.5 0,0.5
7-TopAssy:
  lines w0.05: -1.6,-1 -1.8,-1 -1.8,-0.3 -1.6,-0.3 ; -1.6,0.3 -1.8,0.3 -1.8,1 -1.6,1 ; -1.6,0.8 -1,1.4 ; -0.775,-0.75 -0.675,-0.675 ; -0.775,0.75 -0.675,0.675 ; -0.682,-0.677 cw(c1.2,0) -0.8,0 cw(c1.2,0) -0.682,0.677 ; -0.677,-0.682 ccw(c0,1.2) 0,-0.8 ccw(c0,1.2) 0.677,-0.682 ; -0.677,0.682 cw(c0,-1.2) 0,0.8 cw(c0,-1.2) 0.677,0.682 ; 0.675,-0.675 0.775,-0.75 ; 0.675,0.675 0.775,0.75 ; 0.682,-0.677 ccw(c-1.2,0) 0.8,0 ccw(c-1.2,0) 0.682,0.677 ; 1.6,-1 1.8,-1 1.8,-0.3 1.6,-0.3 ; 1.6,0.3 1.8,0.3 1.8,1 1.6,1 ; -1.6,-1.4 0,-1.4 1.6,-1.4 1.6,0 1.6,1.4 0,1.4 -1.6,1.4 -1.6,0 -1.6,-1.4 ; -1.1,0 cw(c0,0) 0,1.1 cw(c0,0) 1.1,0 cw(c0,0) 0,-1.1 cw(c0,0) -1.1,0 ; -0.1,-0.5 -0.1,-0.3 0.1,-0.3 0.1,-0.5 -0.1,-0.5 ; -0.1,-0.1 0.1,-0.1 0.1,0.1 -0.1,0.1 -0.1,-0.1 ; -0.1,0.3 -0.1,0.5 0.1,0.5 0.1,0.3 -0.1,0.3
  text ".Designator" at -2.3,1.7 h1.8
  text "R" at -2.3,0.5 h0.7
  text "G" at 2,0.5 h0.7
  text "B" at 2,-0.9 h0.7
  text "C" at -2.3,-0.9 h0.7
3D body "LED_CREE_CLVBA-FKA_4-PLCC.STEP": height 1.9, standoff 0, extent -1.75,-1.4 1.75,1.4

## LED_G_3mm [mm]
pads (2):
  oval 1.6x1.3 hole 0.8: 1(0,-1.27) 2(0,1.27)
TopOverlay:
  lines w0.2: -1.4,0.73 -0.9,0.73 ; -0.954,1.285 ccw(c0,0) -0.945,-1.291 ; 0.9,0.73 1.4,0.73 ; 0.945,-1.291 ccw(c0,0) 0.954,1.285
2-TopCompOutl:
  lines w0.1: -0.528,-1.404 cw(c0,0) 0.528,-1.404 ; -0.525,-1.405 0.525,-1.405
4-TopCourty:
  circle w0.1: c0,0 r0.35
  lines w0.05: -1.8,-2.025 1.825,-2.025 1.825,2.025 -1.8,2.025 -1.8,-2.025
  lines w0.1: -0.525,0 0.525,0 ; 0,-0.525 0,0.525
5-MCadOutl:
  lines w0.05: -0.3,0 0,0 ; 0,-0.229 0,0 ; 0,0.254 0,0 ; 0.3,0 0,0
7-TopAssy:
  circle w0.1: c0,-0.005 r1.45
  lines w0.1: -0.7,0.47 0.7,0.47 ; -0.563,-1.498 cw(c0,0) 0.563,-1.498 ; -0.55,-1.505 0.55,-1.505 ; 0,-0.83 0,0.87 ; -0.7,-0.53 0,0.47 0.7,-0.53 -0.7,-0.53 ; -0.25,-1.53 -0.25,-1.03 0.25,-1.03 0.25,-1.53 -0.25,-1.53 ; -0.25,1.02 0.25,1.02 0.25,1.52 -0.25,1.52 -0.25,1.02
  text ".Designator" at -1.175,2.395 h2.2
3D body "LED_G_3mm.STEP": height 14.5, standoff -3.2, extent -1.597,-1.599 1.597,1.588

## LED_G_3mm_90deg [mm]
height 5.04
pads (2):
  round 1.6 hole 0.8: 1(-1.27,0) 2(1.27,0)
TopOverlay:
  lines w0.2: -2.32,-2.85 -2.32,2 2.28,2 2.28,-2.85
2-TopCompOutl:
  drawing of 295 lines, arcs and shapes, not listed
4-TopCourty:
  circle w0.05: c0,0 r0.4
  lines w0.05: -0.575,0 0.575,0 ; 0,-0.55 0,0.55 ; -2.44,-6.95 -2.44,2.2 2.43,2.2 2.43,-6.95 -2.44,-6.95
7-TopAssy:
  lines w0.1: -1.45,-5.4 -1.45,-4.4 ; -1.45,-5.35 ccw(c0,-5.35) 1.45,-5.35 ; 1.45,-5.4 1.45,-4.4 ; -2.3,-4.4 2.3,-4.4 2.3,2 -2.3,2 -2.3,-4.4
  text ".Designator" at 0.53,-3.45 h2.2
3D body "LED_G_3mm_90deg.STEP": height 7.3, standoff -3.5, extent -2.3,-6.8 2.3,1.95

## LED_G_3MM_90DEG_NOPLASTIC [mm]
pads (2):
  oval 1.8x1.6 hole 0.8: 1(0,0) 2(0,-2.54)
TopOverlay:
  lines w0.2: -3.7,-2.7 -2.5,-2.7 ; -2.5,-2.5 -1.1,-2.5 ; -1.1,0 -2.5,0 ; -2.5,0 -2.5,-3 -3.7,-3 -3.7,0.4 -2.5,0.4 -2.5,0
2-TopCompOutl:
  lines w0.1: -4.4,-2.7 -6.6,-2.7 cw(c-6.6,-1.3) -6.6,0.1 -4.4,0.1 -4.4,0.3 -3.4,0.3 -3.4,-2.9 -4.4,-2.9 -4.4,0.2 ; -3.4,-2.8 0,-2.8 0,-2.3 -3.4,-2.3 ; -3.4,-0.3 0,-0.3 0,0.2 -3.4,0.2
4-TopCourty:
  circle w0.1: c0,0 r0.35
  lines w0.05: -8.125,-3.475 -8.125,0.975 1.1,0.975 1.1,-3.475 -8.125,-3.475
  lines w0.1: -0.525,0 0.525,0 ; 0,-0.525 0,0.525
7-TopAssy:
  lines w0.1: -4.4,-2.7 -6.6,-2.7 cw(c-6.6,-1.3) -6.6,0.1 -4.4,0.1 -4.4,0.3 -3.4,0.3 -3.4,-2.9 -4.4,-2.9 -4.4,0.2 ; -3.4,-2.8 0,-2.8 0,-2.3 -3.4,-2.3 ; -3.4,-0.3 0,-0.3 0,0.2 -3.4,0.2
  text ".Designator" at -6.5,0.825 h2.2
3D body "LED_G_3MM_90DEG_NOPLASTIC.STEP": height 2, standoff -2.2, extent -7.875,-2.875 0.275,0.325